# Altium footprint library Lib.PcbLib: 177 footprints (part 10 of 12)
Each footprint in its own frame and in the unit in brackets; x right, y up, seen from the top. Pads: shape width x height; smd on the part's side, far side on the other; paste and mask are expansions set on the pad; w line width, h text height; cw(c..) or ccw(c..) is an arc to the next point about the centre after c.
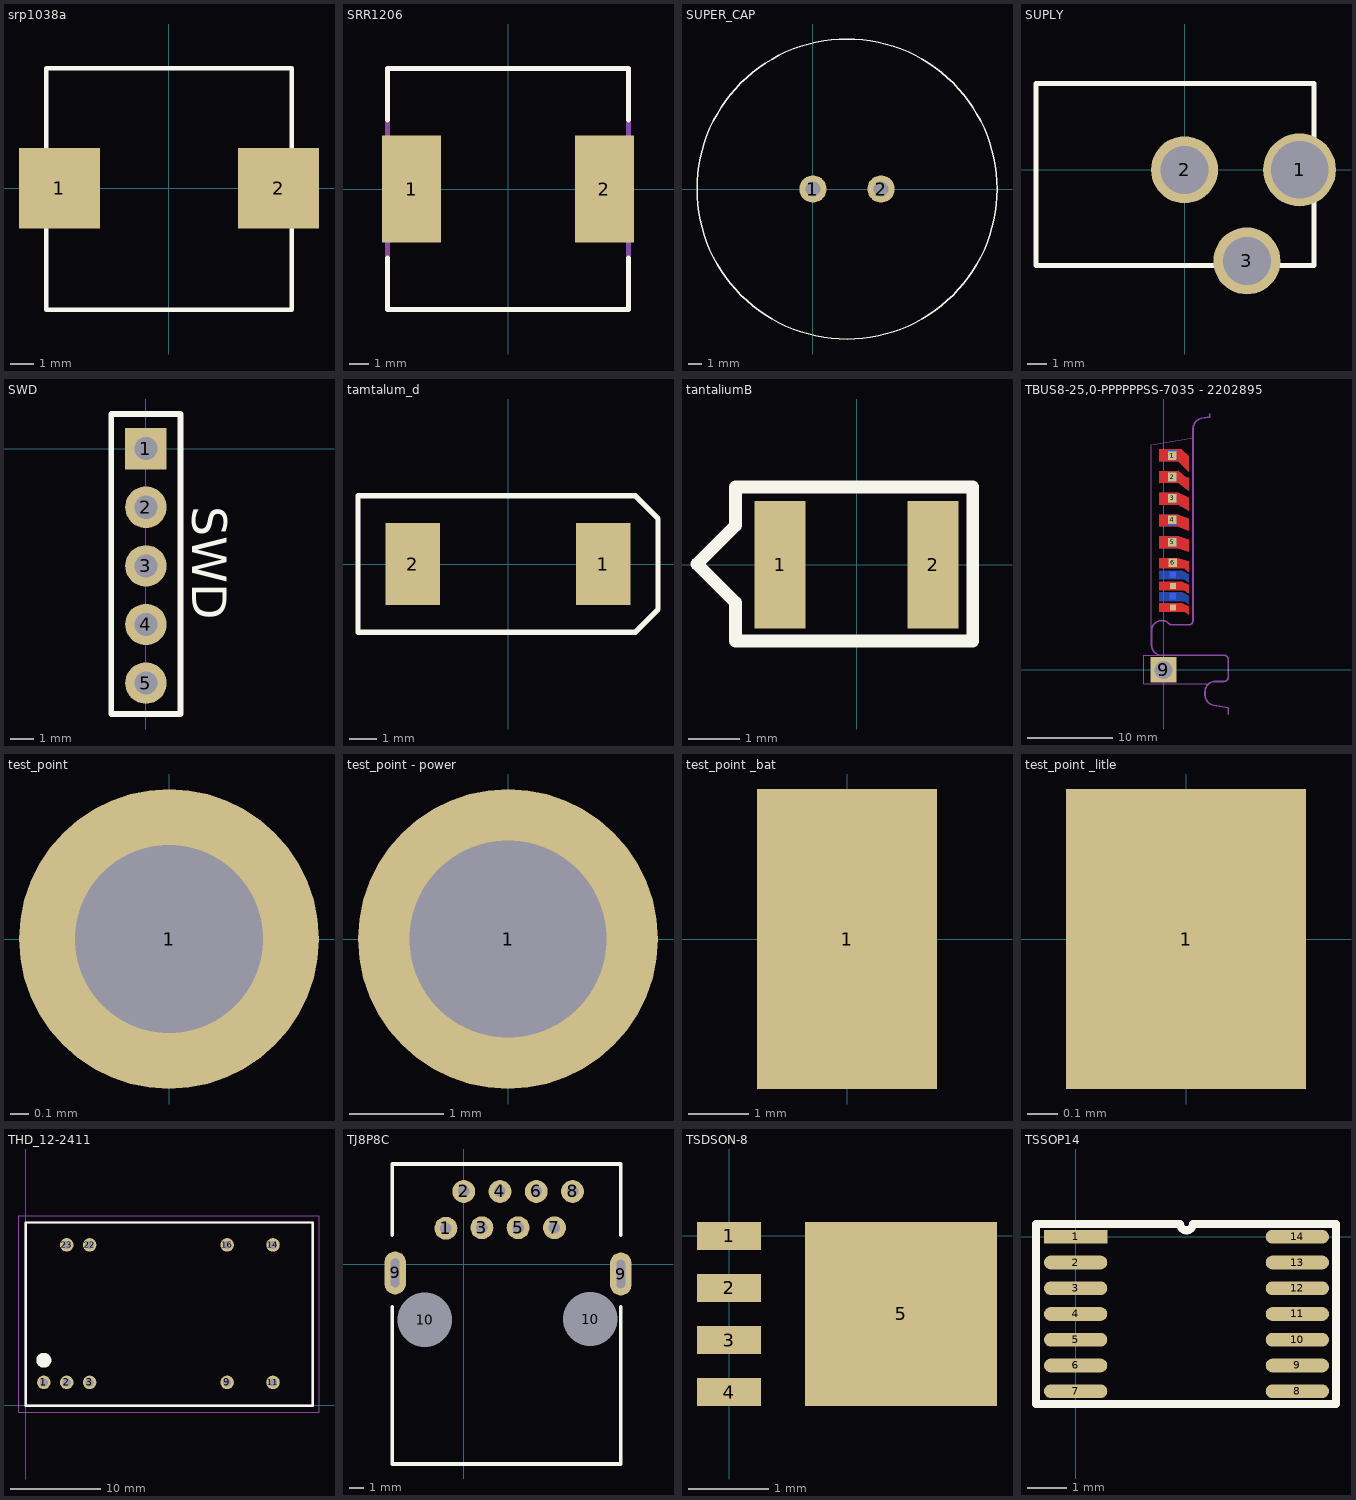
[diagram p9: the footprints below, top view; thin cyan lines are the x and y axes]

## srp1038a [mm]
pads (2):
  rect 3.5x3.5 smd: 1(-4.75,0) 2(4.75,0)
Top Overlay:
  lines w0.2: -5.325,-5.275 -5.325,-1.925 -5.325,5.2 5.325,5.2 5.325,-5.275 -5.325,-5.275
3D body "User Library-B82464G4.STEP": height 4.81, standoff 0, extent -5.175,-5.2 5.225,5.2

## SRR1206 [mm]
pads (2):
  rect 3.1x5.6 smd: 1(-5.05,0) 2(5.05,0)
Top Overlay:
  lines w0.254: -6.3,-3.6 -6.3,-6.3 6.3,-6.3 6.3,-3.6 ; -6.3,3.6 -6.3,6.3 6.3,6.3 6.3,3.6
Mechanical 3:
  lines w0.254: -6.3,-6.3 -6.3,6.3 6.3,6.3 6.3,-6.3 -6.3,-6.3
3D body "70086.stp": height 6.55, standoff 0.05, extent -6.375,-6.35 6.325,6.35

## SUPER_CAP [mm]
pads (2):
  round 2 hole 1.1: 1(0,0) 2(5,0)
Top Overlay:
  circle w0.1: c2.5,0 r11
3D body "User Library-Ionistor.step": height 8.01, standoff -6, extent -8.25,-10.75 13.26,10.75

## SUPLY [mm]
pads (3):
  round 3.8 hole 3: 1(6,0)
  round 3.5 hole 2.5: 2(0,0) 3(3.25,-4.75)
Top Overlay:
  lines w0.254: -7.75,-5 6.75,-5 6.75,4.5 -7.75,4.5 -7.75,-5
3D body "User Library-ds-210.STEP": height 11.5, standoff -3.9, extent -7.75,-5.05 6.75,4.5

## SWD [mm]
pads (5):
  rect 1.8x1.8 hole 1: 1(0,0)
  round 1.8 hole 1: 2(0,-2.54) 3(0,-5.08) 4(0,-7.62) 5(0,-10.16)
Top Overlay:
  lines w0.254: -1.5,-11.5 1.5,-11.5 1.5,1.5 -1.5,1.5 -1.5,-11.5
  text "SWD" at 2,-2.5 h1.5

## tamtalum_d [mm]
pads (2):
  rect 2x3 smd: 1(3.5,0) 2(-3.5,0)
Top Overlay:
  lines w0.2: -5.5,-2.5 -5.5,0 -5.5,2.5 4.667,2.5 5.5,1.667 5.5,-1.667 4.667,-2.5 -5.5,-2.5
3D body "User Library-CaseD_7343-31.STEP": height 2.8, standoff 0, extent -3.675,-2.075 3.625,2.225

## tantaliumB [mm]
pads (2):
  rect 1x2.5 smd: 1(-1.5,0) 2(1.5,0)
Top Overlay:
  lines w0.254: -3.131,0.013 -2.375,-0.744 -2.375,-1.5 2.275,-1.5 2.275,1.525 -2.375,1.525 -2.375,0.769 -3.131,0.013
3D body "User Library-QT02752.STEP": height 1.95, standoff 0.04, extent -1.856,-1.4 1.807,1.4

## TBUS8-25,0-PPPPPPSS-7035 - 2202895 [mm]
height 7
pads (16):
  rect 1x1 smd: 1(1,25) 2(1,22.5) 3(1,20) 4(1,17.5) 5(1,14.9) 6(1.1,12.5)
  rect 1x1 smd far side: 1c(1,25.1) 2c(1,22.5) 3c(1,20) 4c(1,17.4) 5c(1,14.9)
  rect 0.7x0.7 smd: 7(1.1,9.8) 8(1.1,7.3)
  rect 0.7x0.7 smd far side: 7f(1.1,11.07) 8f(1.1,8.6)
  rect 3x3 hole 2.1 unplated: 9(0,0)
Top Layer:
  region: 2.95,8.9 2.95,9.9 2.205,10.3 -0.5,10.3 -0.5,9.3 2.4,9.3
  region: 2.95,6.43 2.95,7.4 2.205,7.76 -0.5,7.76 -0.5,6.76 2.4,6.76
  region: 2.95,11.36 2.95,12.65 1.705,13.04 -0.5,13.05 -0.5,11.85 2.4,11.84
  region: 2.95,13.8 2.95,15.17 1.705,15.58 -0.5,15.575 -0.5,14.175 1.705,14.18
  region: 2.95,16.22 2.95,17.64 1.705,18.12 -0.5,18.125 -0.5,16.75 1.705,16.72
  region: 2.95,18.59 2.95,20.09 1.705,20.66 -0.5,20.65 -0.5,19.25 1.705,19.26
  region: 2.95,20.89 2.95,22.39 2.67,22.39 1.705,23.2 -0.5,23.2 -0.5,21.8 1.705,21.8
  region: 2.95,23.09 2.95,24.91 2.055,25.74 -0.5,25.75 -0.5,24.35 1.705,24.34
  lines w0.005: 2.95,5.25 ccw(c2.95,5.75) 2.97,5.25
Bottom Layer:
  region: 2.95,7.63 2.95,8.63 2.205,9.03 -0.5,9.03 -0.5,8.03 2.4,8.03
  region: 2.95,10.17 2.95,11.17 2.205,11.57 -0.5,11.57 -0.5,10.57 2.4,10.57
  region: 2.95,13.8 2.95,15.17 1.705,15.58 -0.5,15.575 -0.5,14.175 1.705,14.18
  region: 2.95,16.22 2.95,17.64 1.705,18.12 -0.5,18.125 -0.5,16.75 1.705,16.72
  region: 2.95,18.59 2.95,20.09 1.705,20.66 -0.5,20.65 -0.5,19.25 1.705,19.26
  region: 2.95,20.89 2.95,22.39 2.67,22.39 1.705,23.2 -0.5,23.2 -0.5,21.8 1.705,21.8
  region: 2.95,23.09 2.95,24.91 2.055,25.74 -0.5,25.75 -0.5,24.35 1.705,24.34
Mechanical 1:
  lines w0.2: 2.95,5.25 0.775,5.25 ccw(c-0.2,4.55) -1.4,4.55 -1.4,2.9 ccw(c-0.2,2.9) -0.2,1.7 7.05,1.7 cw(c7.05,1.2) 7.55,1.2 7.55,-0.85 cw(c7.05,-0.85) 7.05,-1.35 6.05,-1.35 ccw(c6.05,-2.55) 5.317,-1.6 ccw(c6.05,-2.55) 4.85,-2.55 4.85,-2.947 ccw(c6.05,-2.947) 5.842,-4.128 7.55,-4.43 7.55,-5.15 ; 2.97,5.25 ccw(c2.95,5.75) 3.45,5.75 3.45,27.125 ; 3.45,27.105 3.45,28.158 cw(c4.65,28.158) 4.442,29.34 5.4,29.509 5.4,29.85
Mechanical 3:
  lines w0.05: -1.4,4.55 -1.4,26.25 3.45,27.105 ; -0.2,1.7 -2.3,1.7 -2.3,-1.6 5.317,-1.6
3D body "pxc_2202895_00_TBUS8-25-0-PPPPPPSS-7035_3D (1).stp": height 20, standoff -9.3, extent -2.65,-2.55 13.65,34.599

## test_point [mm]
pads (1):
  round 1.6 hole 1: 1(0,0)

## test_point - power [mm]
pads (1):
  round 3.2 hole 2.1: 1(0,0)

## test_point _bat [mm]
pads (1):
  rect 3x5 smd: 1(0,0)

## test_point _litle [mm]
pads (1):
  rect 0.8x1 smd: 1(0,0)

## THD_12-2411 [mm]
pads (9):
  round 1.5 hole 0.9: 1(2,2.54) 2(4.54,2.54) 3(7.08,2.54) 9(22.32,2.54) 11(27.4,2.54) 14(27.4,17.78) 16(22.32,17.78) 22(7.08,17.78) 23(4.54,17.78)
Top Overlay:
  circle w1.254: c2,5 r0.2
  lines w0.254: 0,-0.04 0,20.26 31.8,20.26 31.8,-0.04 0,-0.04
Mechanical 3:
  lines w0.254: 0,-0.04 31.8,-0.04 31.8,20.26 0,20.26 0,-0.04
Mechanical 13:
  lines w0.1: 0,-0.04 0,20.26 31.8,20.26 31.8,-0.04 0,-0.04
Mechanical 15:
  lines w0.05: -0.75,-0.75 -0.75,21 32.5,21 32.5,-0.75 -0.75,-0.75
  lines w0.1: 4,2.5 5,2.5 ; 4.1,2.45 5.1,2.45 ; 4.5,2 4.5,3 4.5,2
3D body "thd12.stp": height 11.4, standoff -2.5, extent 0,0 31.8,20.3

## TJ8P8C [mm]
pads (12):
  round 1.6 hole 0.8: 1(-1.25,2.5) 2(0,5.08) 3(1.27,2.54) 4(2.54,5.08) 5(3.81,2.54) 6(5.08,5.08) 7(6.35,2.54) 8(7.62,5.08)
  oval 1.5x3 hole 0.6 slot 2 at 90 deg: 9(-4.8,-0.625) 9(11,-0.7)
  round 1.524 hole 3.8: 10(-2.725,-3.9) 10(8.85,-3.85)
Top Overlay:
  lines w0.254: -5,-3 -5,-14 11,-14 11,-3 ; -5,2 -5,7 11,7 11,2
3D body "User Library-RJ-45 (TJ7-8P8C).STEP": height 13.7, standoff -4, extent -4.85,-14.55 11.15,6.85

## TSDSON-8 [mm]
pads (5):
  rect 0.8x0.35 smd: 1(0,0) 2(0,-0.65) 3(0,-1.3) 4(0,-1.95)
  rect 2.4x2.3 smd: 5(2.15,-0.975)
3D body "User Library-PG-TSDSON-8-1.STEP": height 1.11, standoff 0, extent -0.175,-2.675 3.225,0.725

## TSSOP14 [mm]
pads (14):
  rect 1.6x0.35 smd: 1(0,0)
  oval 1.6x0.35 smd: 2(0,-0.65) 3(0,-1.3) 4(0,-1.95) 5(0,-2.6) 6(0,-3.25) 7(0,-3.9) 8(5.6,-3.9) 9(5.6,-3.25) 10(5.6,-2.6) 11(5.6,-1.95) 12(5.6,-1.3) 13(5.6,-0.65) 14(5.6,0)
Top Overlay:
  lines w0.2: -1,-4.225 -1,0.325 2.638,0.325 ccw(c2.8,0.325) 2.962,0.325 6.575,0.325 6.575,-4.225 -1,-4.225
3D body "User Library-tssop14-2.step": height 1.2, standoff 0, extent -0.4,-4.5 6,0.6